# Altium footprint library SparkFun-Connectors.PCBLIB: 409 footprints (part 21 of 26)
Each footprint in its own frame and in the unit in brackets; x right, y up, seen from the top. Pads: shape width x height; smd on the part's side, far side on the other; paste and mask are expansions set on the pad; w line width, h text height; cw(c..) or ccw(c..) is an arc to the next point about the centre after c.
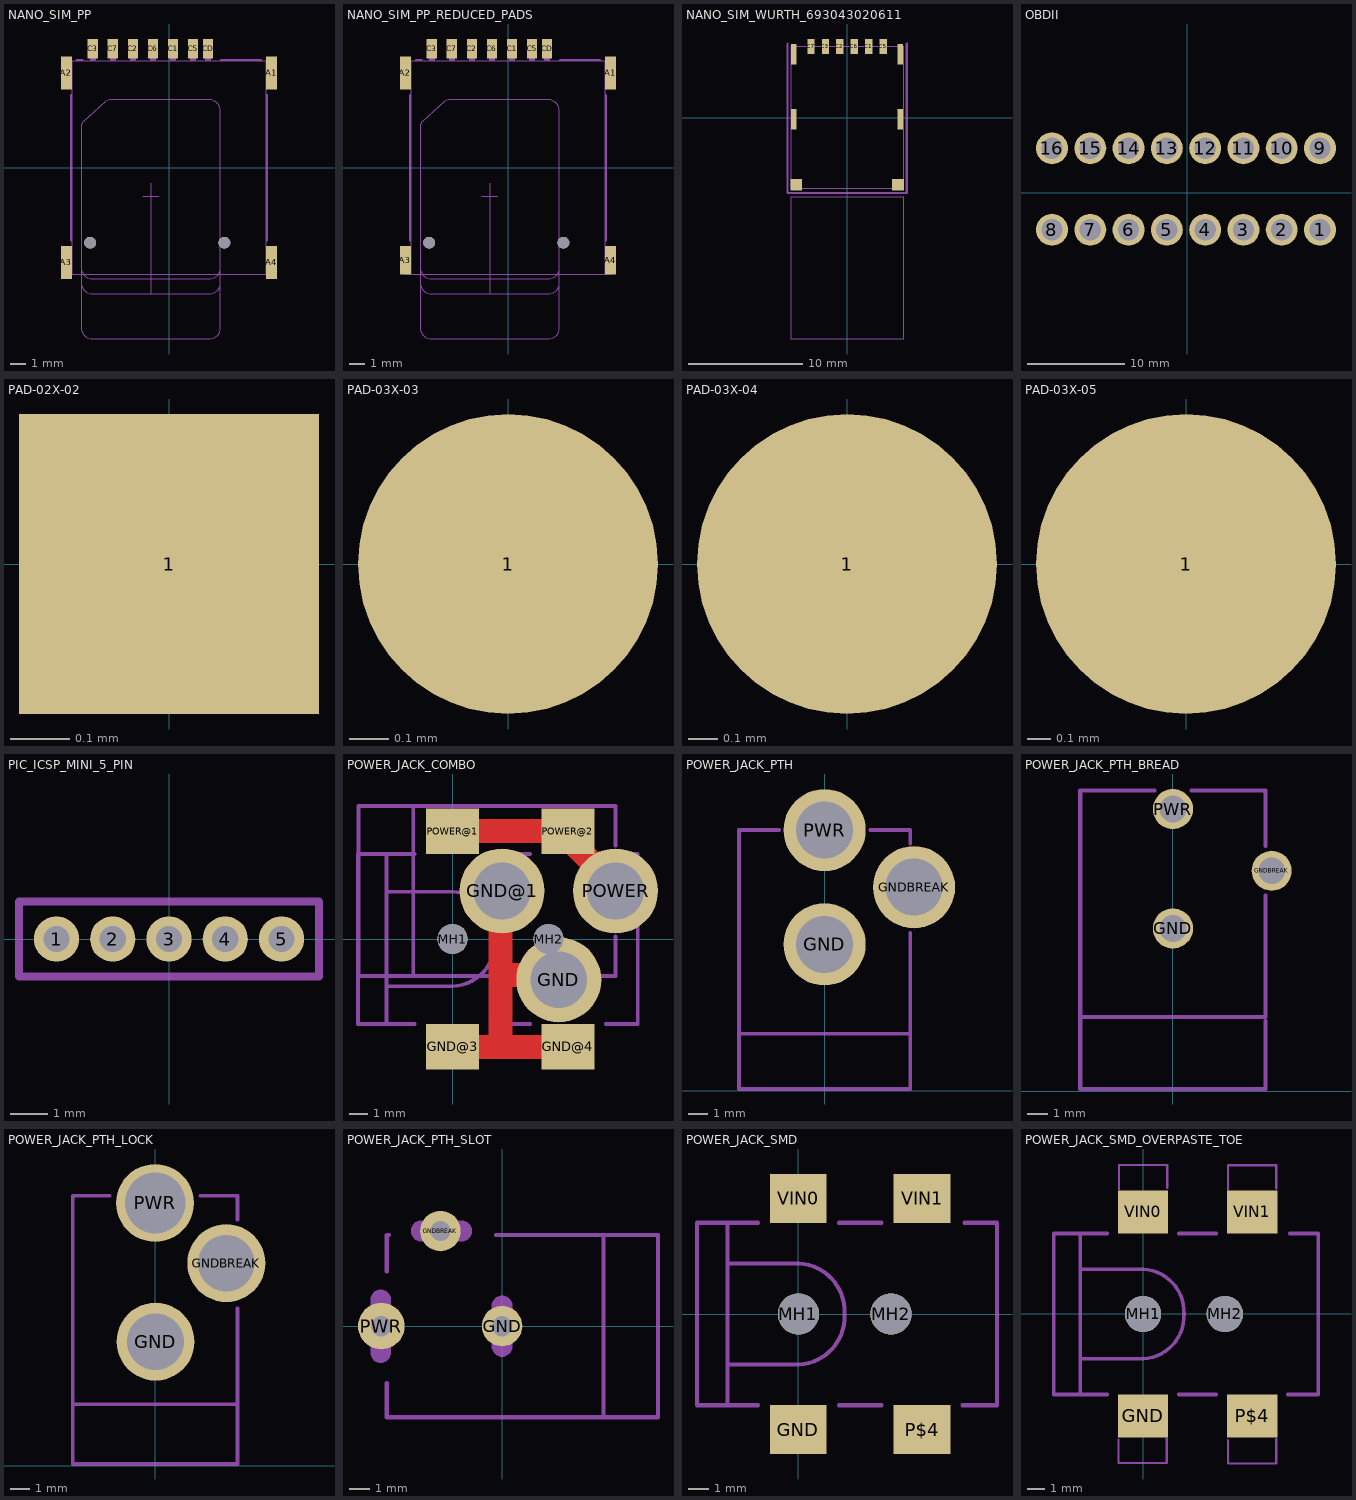
[diagram p20: the footprints below, top view; thin cyan lines are the x and y axes]

## NANO_SIM_PP [mm]
pads (13):
  rect 0.7x2.1 smd: A1(6.495,6) A2(-6.495,6) A3(-6.495,-6) A4(6.495,-6)
  rect 0.65x1.23 smd: C1(0.255,7.535) C2(-2.285,7.535) C3(-4.825,7.535) C5(1.525,7.535) C6(-1.015,7.535) C7(-3.555,7.535) CD(2.475,7.535)
  round 0.75 hole 0.75 unplated: MH1(3.505,-4.75) MH2(-4.995,-4.75)
tDocu:
  region: 0.085,6.75 0.085,7.85 0.435,7.85 0.435,6.75
  region: -1.185,6.75 -1.185,7.85 -0.835,7.85 -0.835,6.75
  region: -2.455,6.75 -2.455,7.85 -2.105,7.85 -2.105,6.75
  region: -3.725,6.75 -3.725,7.85 -3.375,7.85 -3.375,6.75
  region: -4.995,6.75 -4.995,7.85 -4.645,7.85 -4.645,6.75
  region: 1.355,6.75 1.355,7.85 1.705,7.85 1.705,6.75
  region: 2.305,6.75 2.305,7.85 2.655,7.85 2.655,6.75
  region: -6.545,5.25 -6.545,6.75 -6.145,6.75 -6.145,5.25
  region: -6.545,-6.75 -6.545,-5.25 -6.145,-5.25 -6.145,-6.75
  region: 6.145,5.25 6.145,6.75 6.545,6.75 6.545,5.25
  region: 6.145,-6.75 6.145,-5.25 6.545,-5.25 6.545,-6.75
  lines w0.05: -1.15,-8 -1.15,-1 ; -6.145,-6.75 -6.145,6.75 6.145,6.75 6.145,-6.75 -6.145,-6.75
tPlace:
  lines w0.152: -6.2,-4.6 -6.2,4.6 ; -5.8,6.8 -5.5,6.8 ; 3.3,6.8 5.8,6.8 ; 6.2,-4.6 6.2,4.6
Measures:
  lines w0.05: -5.55,-6.35 ccw(c-4.856,-6.356) -4.861,-7.05 2.55,-7.05 ccw(c2.556,-6.356) 3.25,-6.361 ; -5.55,-0.2 -5.55,-10.15 ccw(c-4.856,-10.156) -4.861,-10.85 2.55,-10.85 ccw(c2.556,-10.156) 3.25,-10.161 3.25,0.75 ; -1.65,-1.85 -0.65,-1.85 ; -1.15,-2.35 -1.15,-1.35 ; -5.55,-7.3 -5.55,2.65 cw(c-5.169,2.647) -5.4,2.95 -4,4.2 cw(c-3.684,3.756) -3.65,4.3 2.561,4.3 cw(c2.556,3.606) 3.25,3.6 3.25,-7.311 cw(c2.556,-7.306) 2.55,-8 -4.861,-8 cw(c-4.856,-7.306) -5.55,-7.3

## NANO_SIM_PP_REDUCED_PADS [mm]
pads (13):
  rect 0.7x2.1 smd: A1(6.495,6) A2(-6.495,6)
  rect 0.7x1.8 smd: A3(-6.495,-5.85) A4(6.495,-5.85)
  rect 0.65x1.23 smd: C1(0.255,7.535) C2(-2.285,7.535) C3(-4.825,7.535) C5(1.525,7.535) C6(-1.015,7.535) C7(-3.555,7.535) CD(2.475,7.535)
  round 0.75 hole 0.75 unplated: MH1(3.505,-4.75) MH2(-4.995,-4.75)
tDocu:
  region: 0.085,6.75 0.085,7.85 0.435,7.85 0.435,6.75
  region: -1.185,6.75 -1.185,7.85 -0.835,7.85 -0.835,6.75
  region: -2.455,6.75 -2.455,7.85 -2.105,7.85 -2.105,6.75
  region: -3.725,6.75 -3.725,7.85 -3.375,7.85 -3.375,6.75
  region: -4.995,6.75 -4.995,7.85 -4.645,7.85 -4.645,6.75
  region: 1.355,6.75 1.355,7.85 1.705,7.85 1.705,6.75
  region: 2.305,6.75 2.305,7.85 2.655,7.85 2.655,6.75
  region: -6.545,5.25 -6.545,6.75 -6.145,6.75 -6.145,5.25
  region: -6.545,-6.75 -6.545,-5.25 -6.145,-5.25 -6.145,-6.75
  region: 6.145,5.25 6.145,6.75 6.545,6.75 6.545,5.25
  region: 6.145,-6.75 6.145,-5.25 6.545,-5.25 6.545,-6.75
  lines w0.05: -1.15,-8 -1.15,-1 ; -6.145,-6.75 -6.145,6.75 6.145,6.75 6.145,-6.75 -6.145,-6.75
tPlace:
  lines w0.152: -6.2,-4.6 -6.2,4.6 ; -5.8,6.8 -5.5,6.8 ; 3.3,6.8 5.8,6.8 ; 6.2,-4.6 6.2,4.6
Measures:
  lines w0.05: -5.55,-6.35 ccw(c-4.856,-6.356) -4.861,-7.05 2.55,-7.05 ccw(c2.556,-6.356) 3.25,-6.361 ; -5.55,-0.2 -5.55,-10.15 ccw(c-4.856,-10.156) -4.861,-10.85 2.55,-10.85 ccw(c2.556,-10.156) 3.25,-10.161 3.25,0.75 ; -1.65,-1.85 -0.65,-1.85 ; -1.15,-2.35 -1.15,-1.35 ; -5.55,-7.3 -5.55,2.65 cw(c-5.169,2.647) -5.4,2.95 -4,4.2 cw(c-3.684,3.756) -3.65,4.3 2.561,4.3 cw(c2.556,3.606) 3.25,3.6 3.25,-7.311 cw(c2.556,-7.306) 2.55,-8 -4.861,-8 cw(c-4.856,-7.306) -5.55,-7.3

## NANO_SIM_WURTH_693043020611 [mm]
pads (12):
  rect 0.65x1.3 smd: C1(1.905,6.25) C2(-0.635,6.25) C3(-1.905,6.25) C5(3.175,6.25) C6(0.635,6.25) C7(-3.175,6.25)
  rect 0.48x1.8 smd: MNT1(-4.69,5.58) MNT2(4.66,5.58) MNT3(-4.69,-0.17) MNT4(4.66,-0.17)
  rect 1.03x1 smd: MNT5(-4.465,-5.89) MNT6(4.465,-5.89)
tDocu:
  lines w0.025: -4.93,-19.458 -4.93,-6.958 4.93,-6.958 4.93,-19.458 -4.93,-19.458 ; -4.93,-6.25 -4.93,6.25 4.93,6.25 4.93,-6.25 -4.93,-6.25
  text "Nano SIM CARD" at 0,-12.7 h0.79
  text "Clear area needed" at 0,-13.589 h0.79
  text "for card insertion" at 0,-14.351 h0.79
tPlace:
  lines w0.203: -5.235,6.504 -5.235,-6.631 5.235,-6.631 5.235,6.504

## OBDII [mil]
pads (16):
  round 129.91 hole 86.61: 1(538.58,-150) 2(383.07,-150) 3(227.56,-150) 4(72.05,-150) 5(-83.46,-150) 6(-238.98,-150) 7(-394.49,-150) 8(-550,-150) 9(538.58,180.71) 10(383.07,180.71) 11(227.56,180.71) 12(72.05,180.71) 13(-83.46,180.71) 14(-238.98,180.71) 15(-394.49,180.71) 16(-550,180.71)
tPlace:
  text "1" at 525,-75 h42.5
  text "16" at -600,50 h42.5
bPlace:
  text "16" at -500,50 h42.5
  text "1" at 575,-75 h42.5

## PAD-02X-02 [mil]
pads (1):
  rect 20x20 smd paste+0: 1(0,0)

## PAD-03X-03 [mil]
pads (1):
  rrect100% 30x30 smd paste+0: 1(0,0)

## PAD-03X-04 [mil]
pads (1):
  rrect100% 40x40 smd paste+0: 1(0,0)

## PAD-03X-05 [mil]
pads (1):
  rrect100% 50x50 smd paste+0: 1(0,0)

## PIC_ICSP_MINI_5_PIN [mm]
pads (5):
  round 1.208 hole 0.7: 1(-3,0) 2(-1.5,0) 3(0,0) 4(1.5,0) 5(3,0)
tDocu:
  lines w0.203: -4,-1 -4,1 4,1 4,-1 -4,-1
tPlace:
  lines w0.203: -3.6,1 -2.4,1
bPlace:
  lines w0.203: -3.594,1 -2.394,1

## POWER_JACK_COMBO [mil]
pads (9):
  round 177 hole 118: GND(221.26,-85.04) GND@1(103.15,100) POWER(339.37,100)
  rect 110.24x94.49 smd: GND@3(0,-224.41) GND@4(240.16,-224.41) POWER@1(0,224.41) POWER@2(240.16,224.41)
  round 62.99 hole 62.99 unplated: MH1(0,0) MH2(200,0)
Top:
  lines w50: 0,-225 100,-225 ; 0,225 250,225 250,200 350,100 ; 100,100 100,-75 ; 225,-75 100,-75 ; 250,-225 100,-225 ; 100,-225 100,-75
tDocu:
  lines w8: -78.74,-177.17 -137.8,-177.17 ; -78.74,177.17 -137.8,177.17 ; 78.74,-177.17 161.42,-177.17 ; 78.74,177.17 161.42,177.17 ; 126.77,-77.17 -81.89,-77.17 ; 311.81,-77.17 339.37,-77.17 339.37,5.51 ; 318.9,-177.17 385.83,-177.17 385.83,177.17 322.83,177.17 ; 339.37,194.49 339.37,277.17 -81.89,277.17 ; -137.8,-177.17 -196.85,-177.17 -196.85,177.17 -137.8,177.17 ; -137.8,-177.17 -137.8,-98.43 ; -137.8,-98.43 -137.8,98.43 ; -137.8,-98.43 0,-98.43 ccw(c-4.21,-4.21) 90,0 ccw(c-4.21,4.21) 0,98.43 -137.8,98.43 ; -137.8,98.43 -137.8,177.17 ; -81.89,-77.17 -196.06,-77.17 -196.06,277.17 -81.89,277.17 ; -81.89,-77.17 -81.89,277.17

## POWER_JACK_PTH [mil]
pads (3):
  round 170 hole 118: GND(0,303.15) GNDBREAK(185.04,421.26) PWR(0,539.37)
tDocu:
  lines w8: -177.17,118.11 -177.17,3.94 177.17,3.94 177.17,118.11
tPlace:
  lines w8: -94.49,539.37 -177.17,539.37 -177.17,118.11 177.17,118.11 177.17,326.77 ; 94.49,539.37 177.17,539.37 177.17,511.81

## POWER_JACK_PTH_BREAD [mm]
pads (3):
  round 1.95 hole 1.3: GND(0,7.9) GNDBREAK(4.8,10.7) PWR(0,13.7)
tDocu:
  lines w0.203: -4.5,3.6 -4.5,0.1 4.5,0.1 4.5,3.4
tPlace:
  lines w0.203: -0.9,14.6 -4.5,14.6 -4.5,3.6 4.5,3.6 4.5,9.5 ; 0.9,14.6 4.5,14.6 4.5,11.9

## POWER_JACK_PTH_LOCK [mil]
pads (3):
  round 162 hole 118: GND(1,258.15) GNDBREAK(148.09,421.26)
  round 162 hole 125.98: PWR(0,546.37)
tDocu:
  region: 58,528 -57,528 -57,546 58,546
  region: 48,291 -48,291 -48,302 48,302
  region: 187,469 187,373 176,373 176,469
  lines w8: -171.17,129.11 -171.17,3.94 171.17,3.94 171.17,129.11
tPlace:
  lines w8: -94.49,561.37 -171.17,561.37 -171.17,128.11 171.17,128.11 171.17,326.77 ; 94.49,561.37 171.17,561.37 171.17,511.81

## POWER_JACK_PTH_SLOT [mm]
pads (3):
  round 2 hole 1: GND(0,0) GNDBREAK(-3.048,4.699)
  round 2.3 hole 1: PWR(-5.969,0)
Milling:
  region: -4,5.2 -2,5.2 -1.901,5.2 -1.717,5.124 -1.576,4.983 -1.5,4.799 -1.5,4.6 -1.576,4.417 -1.717,4.276 -1.901,4.2 -2,4.2 -4,4.2 -4.099,4.2 -4.283,4.276 -4.424,4.417 -4.5,4.6 -4.5,4.799 -4.424,4.983 -4.283,5.124 -4.099,5.2 -4,5.2
  region: -0.5,-1 -0.5,1 -0.5,1.099 -0.424,1.283 -0.283,1.424 -0.099,1.5 0.099,1.5 0.283,1.424 0.424,1.283 0.5,1.099 0.5,1 0.5,-1 0.5,-1.099 0.424,-1.283 0.283,-1.424 0.099,-1.5 -0.099,-1.5 -0.283,-1.424 -0.424,-1.283 -0.5,-1.099 -0.5,-1
  region: -6.5,-1.3 -6.5,1.3 -6.5,1.399 -6.424,1.583 -6.283,1.724 -6.1,1.8 -5.901,1.8 -5.717,1.724 -5.576,1.583 -5.5,1.399 -5.5,1.3 -5.5,-1.3 -5.5,-1.399 -5.576,-1.583 -5.717,-1.724 -5.901,-1.8 -6.1,-1.8 -6.283,-1.724 -6.424,-1.583 -6.5,-1.399 -6.5,-1.3
tDocu:
  lines w0.203: 5,-4.5 7.7,-4.5 7.7,4.5 5,4.5
tPlace:
  lines w0.203: -5.7,-2.8 -5.7,-4.5 5,-4.5 5,4.5 -0.3,4.5 ; -5.7,2.7 -5.7,4.5 -5.6,4.5

## POWER_JACK_SMD [mil]
pads (6):
  rect 110.24x94.49 smd: GND(0,-224.41) P$4(240.16,-224.41) VIN0(0,224.41) VIN1(240.16,224.41)
  round 80 hole 80 unplated: MH1(0,0) MH2(180,0)
tDocu:
  lines w8: -137.8,-177.17 -196.85,-177.17 -196.85,177.17 -137.8,177.17
tPlace:
  lines w8: -78.74,-177.17 -137.8,-177.17 -137.8,-98.43 ; -78.74,177.17 -137.8,177.17 -137.8,98.43 ; 78.74,-177.17 161.42,-177.17 ; 78.74,177.17 161.42,177.17 ; 318.9,-177.17 385.83,-177.17 385.83,177.17 322.83,177.17 ; -137.8,-98.43 -137.8,98.43 ; -137.8,-98.43 0,-98.43 ccw(c-4.21,-4.21) 90,0 ccw(c-4.21,4.21) 0,98.43 -137.8,98.43

## POWER_JACK_SMD_OVERPASTE_TOE [mil]
pads (6):
  rect 110.24x94.49 smd: GND(0,-224.41) P$4(240.16,-224.41) VIN0(0,224.41) VIN1(240.16,224.41)
  round 80 hole 80 unplated: MH1(0,0) MH2(180,0)
Top Paste:
  region: -55.1,-330 -55.1,-271.5 55.1,-271.5 55.1,-330
  region: 185.1,-330.1 185.1,-271.6 295.3,-271.6 295.3,-330.1
  region: 295.3,330 295.3,271.5 185.1,271.5 185.1,330
  region: 55.1,330 55.1,271.5 -55.1,271.5 -55.1,330
tDocu:
  lines w5: -54,-277 -54,-328 52,-328 52,-274 ; -53,274 -53,328 53,328 53,277 ; 187,-278 187,-329 293,-329 293,-275 ; 187,273 187,327 293,327 293,276
  lines w8: -137.8,-177.17 -196.85,-177.17 -196.85,177.17 -137.8,177.17
  text "OVERPASTE" at -48,310 h10.2
  text "OVERPASTE" at 192,309 h10.2
  text "OVERPASTE" at 47,-310 h10.2
  text "OVERPASTE" at 288,-311 h10.2
tPlace:
  lines w8: -78.74,-177.17 -137.8,-177.17 -137.8,-98.43 ; -78.74,177.17 -137.8,177.17 -137.8,98.43 ; 78.74,-177.17 161.42,-177.17 ; 78.74,177.17 161.42,177.17 ; 318.9,-177.17 385.83,-177.17 385.83,177.17 322.83,177.17 ; -137.8,-98.43 -137.8,98.43 ; -137.8,-98.43 0,-98.43 ccw(c-4.21,-4.21) 90,0 ccw(c-4.21,4.21) 0,98.43 -137.8,98.43
Mech64:
  drawing of 250 lines, arcs and shapes, not listed
  text "//kentro/work/Production/AOI Parts/Tyler/Breadboard power 5v/barreljack.bmp" at 390,-268 h1.7